# Altium footprint library User.PcbLib: 317 footprints (part 18 of 20)
Each footprint in its own frame and in the unit in brackets; x right, y up, seen from the top. Pads: shape width x height; smd on the part's side, far side on the other; paste and mask are expansions set on the pad; w line width, h text height; cw(c..) or ccw(c..) is an arc to the next point about the centre after c.
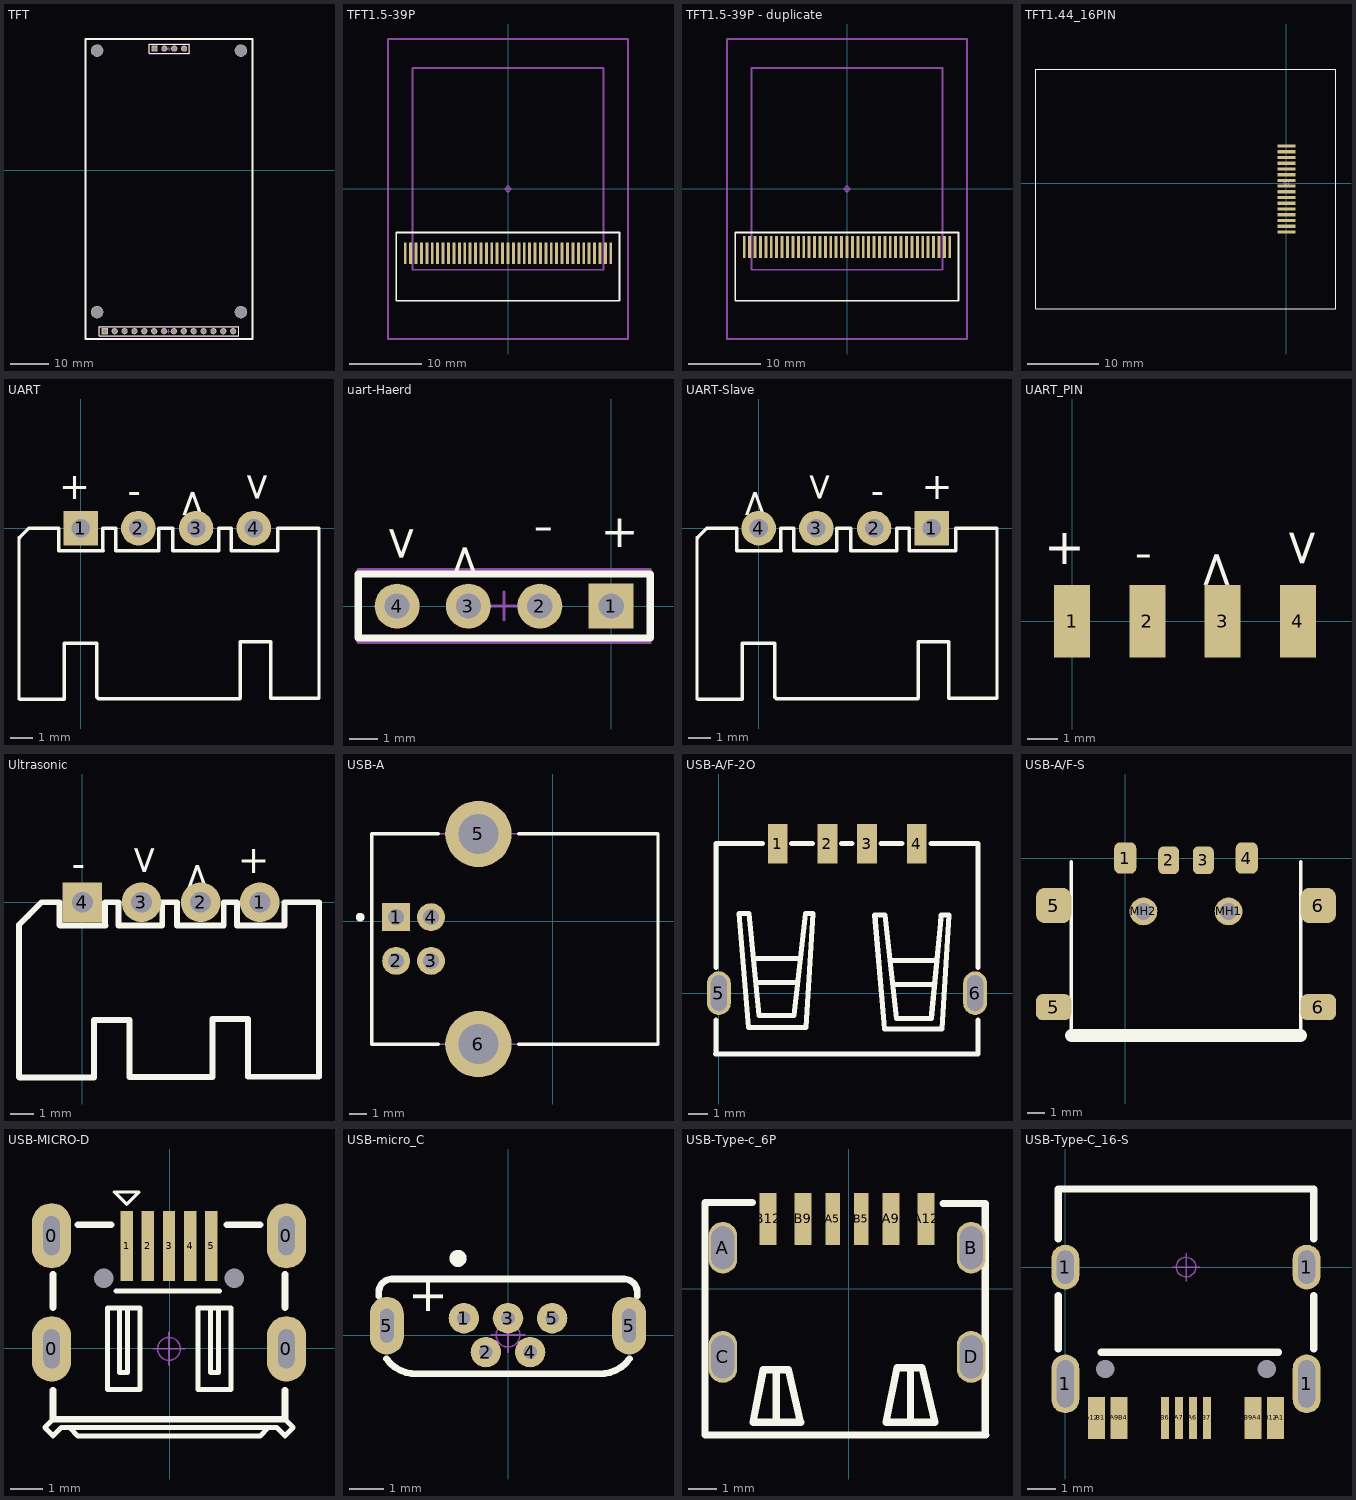
[diagram p17: the footprints below, top view; thin cyan lines are the x and y axes]

## TFT [mm] "SPI_4+14"
pads (22):
  rect 1.6x1.6 hole 1.2: 1(50.832,31.225) 5(38.045,-41.475)
  round 1.6 hole 1.2: 2(53.372,31.225) 3(55.912,31.225) 4(58.452,31.225) 6(40.585,-41.475) 7(43.125,-41.475) 8(45.665,-41.475) 9(48.205,-41.475) 10(50.745,-41.475) 11(53.285,-41.475) 12(55.825,-41.475) 13(58.365,-41.475) 14(60.905,-41.475) 15(63.445,-41.475) 16(65.985,-41.475) 17(68.525,-41.475) 18(71.065,-41.475)
  round 3.2 hole 3: ""(36.075,-36.555) ""(36.075,30.705) ""(73.045,-36.555) ""(73.045,30.705)
Top Overlay:
  lines w0.254: 36.655,-42.618 72.445,-42.618 72.445,-40.332 36.655,-40.332 36.655,-42.618 ; 49.442,30.082 59.832,30.082 59.832,32.368 49.442,32.368 49.442,30.082
  lines w0.5: 33.075,-43.475 76.045,-43.475 76.045,33.705 33.075,33.705 33.075,-43.475
Mechanical 15:
  lines w0.1: 54.055,-41.475 55.055,-41.475 ; 54.142,31.225 55.142,31.225 ; 54.555,-41.975 54.555,-40.975 ; 54.642,30.725 54.642,31.725 ; 36.655,-42.775 72.455,-42.775 72.455,-40.175 36.655,-40.175 36.655,-42.775 ; 49.442,29.925 59.842,29.925 59.842,32.525 49.442,32.525 49.442,29.925
3D body "Header-F-2.54X4.stp": height 8.6, standoff -3.1, extent 49.437,29.975 59.847,32.475
3D body "Header-F-2.54X14.stp": height 8.6, standoff -3.1, extent 36.65,-42.725 72.46,-40.225

## TFT1.5-39P [mm] "长41.6mm，宽33.4mm，厚2.7mm，脚距0.75mm"
pads (39):
  rect 0.4x3 smd: 1(-14.25,-8.89) 2(-13.5,-8.89) 3(-12.75,-8.89) 4(-12,-8.89) 5(-11.25,-8.89) 6(-10.5,-8.89) 7(-9.75,-8.89) 8(-9,-8.89) 9(-8.25,-8.89) 10(-7.5,-8.89) 11(-6.75,-8.89) 12(-6,-8.89) 13(-5.25,-8.89) 14(-4.5,-8.89) 15(-3.75,-8.89) 16(-3,-8.89) 17(-2.25,-8.89) 18(-1.5,-8.89) 19(-0.75,-8.89) 20(0,-8.89) 21(0.75,-8.89) 22(1.5,-8.89) 23(2.25,-8.89) 24(3,-8.89) 25(3.75,-8.89) 26(4.5,-8.89) 27(5.25,-8.89) 28(6,-8.89) 29(6.75,-8.89) 30(7.5,-8.89) 31(8.25,-8.89) 32(9,-8.89) 33(9.75,-8.89) 34(10.5,-8.89) 35(11.25,-8.89) 36(12,-8.89) 37(12.75,-8.89) 38(13.5,-8.89) 39(14.25,-8.89)
Top Overlay:
  lines w0.254: -15.495,-15.5 15.468,-15.5 15.468,-6.05 -15.495,-6.05 -15.495,-15.5
Mechanical 15:
  circle w0.05: c0,0 r0.35
  lines w0.05: -0.5,0 0.5,0 ; 0,-0.5 0,0.5
  lines w0.254: -16.65,-20.8 16.65,-20.8 16.65,20.8 -16.65,20.8 -16.65,-20.8 ; -13.25,-11.2 -13.25,7.7 -13.25,16.8 13.25,16.8 13.25,-11.2 -13.25,-11.2
3D body "TFT1.5-39P.STEP": height 6.65, standoff 0, extent -16.65,-20.884 16.65,20.85

## TFT1.5-39P - duplicate [mm] "长41.6mm，宽33.4mm，厚2.7mm，脚距0.75mm"
pads (39):
  rect 0.4x3 smd: 1(-14.25,-8.05) 2(-13.5,-8.05) 3(-12.75,-8.05) 4(-12,-8.05) 5(-11.25,-8.05) 6(-10.5,-8.05) 7(-9.75,-8.05) 8(-9,-8.05) 9(-8.25,-8.05) 10(-7.5,-8.05) 11(-6.75,-8.05) 12(-6,-8.05) 13(-5.25,-8.05) 14(-4.5,-8.05) 15(-3.75,-8.05) 16(-3,-8.05) 17(-2.25,-8.05) 18(-1.5,-8.05) 19(-0.75,-8.05) 20(0,-8.05) 21(0.75,-8.05) 22(1.5,-8.05) 23(2.25,-8.05) 24(3,-8.05) 25(3.75,-8.05) 26(4.5,-8.05) 27(5.25,-8.05) 28(6,-8.05) 29(6.75,-8.05) 30(7.5,-8.05) 31(8.25,-8.05) 32(9,-8.05) 33(9.75,-8.05) 34(10.5,-8.05) 35(11.25,-8.05) 36(12,-8.05) 37(12.75,-8.05) 38(13.5,-8.05) 39(14.25,-8.05)
Top Overlay:
  lines w0.254: -15.495,-15.5 -15.495,-6.05 15.468,-6.05 15.468,-15.5 -15.495,-15.5
Mechanical 15:
  circle w0.05: c0,0 r0.35
  lines w0.05: -0.5,0 0.5,0 ; 0,-0.5 0,0.5
  lines w0.254: -16.65,-20.8 -16.65,20.8 16.65,20.8 16.65,-20.8 -16.65,-20.8 ; -13.25,-11.2 13.25,-11.2 13.25,16.8 -13.25,16.8 -13.25,7.7 -13.25,-11.2
3D body "TFT1.5-39P.STEP": height 6.65, standoff 0, extent -16.65,-20.884 16.65,20.85

## TFT1.44_16PIN [mm]
pads (16):
  rect 2.5x0.45 smd: 1(0,5.2) 2(0,4.4) 3(0,3.6) 4(0,2.8) 5(0,2) 6(0,1.2) 7(0,0.4) 8(0,-0.4) 9(0,-1.2) 10(0,-2) 11(0,-2.8) 12(0,-3.6) 13(0,-4.4) 14(0,-5.2) 15(0,-6) 16(0,-6.8)
Top Overlay:
  lines w0.127: -35.015,-17.57 6.925,-17.57 6.925,15.958 -35.015,15.958 -35.015,-17.57
Mechanical 15:
  circle w0.05: c0,0 r0.35
  lines w0.05: -0.5,0 0.5,0 ; 0,-0.5 0,0.5
3D body "TFT1.44.STEP": height 2.75, standoff -0.01, extent -35.044,-17.481 6.896,15.869

## UART [mil] "-XH2.54-4PIN"
pads (4):
  rect 60x60 hole 32: 1(0,0)
  round 60 hole 32: 2(100,0) 3(200,0) 4(300,0)
Top Overlay:
  lines w6.06: 26.14,-199.13 -28.11,-199.13 -28.11,-296.38 -105.91,-296.38 -106.93,-295.35 -106.93,-16.93 -103.07,-13.07 -90,0 -38.35,0 -38.35,-38.66 -37.8,-39.21 39.21,-39.21 38.66,-38.66 38.66,0 61.18,0 61.18,-39.45 134.65,-39.45 135.2,-38.9 135.2,0 ; 28.19,-199.13 28.19,-293.31 30.24,-295.35 275.91,-295.35 276.93,-294.33 276.93,-198.11 ; 135.67,0 159.21,0 ; 159.76,-39.21 159.76,0 ; 160.55,-39.21 238.82,-39.21 239.06,-38.98 239.06,0 260.55,0 ; 261.1,0 261.1,-39.45 341.97,-39.45 ; 276.93,-197.09 329.13,-197.09 329.61,-197.56 329.61,-294.88 413.07,-294.88 413.07,0 343.54,0 ; 341.97,-38.43 341.97,0
  text "<" at 270.11,44 h80
  text "+" at 17,34.23 h80
  text "<" at 229.89,69 h80
  text "-" at 82,92.23 h80
  text "<" at 270.11,44 h80
  text "+" at 17,34.23 h80
  text "<" at 229.89,69 h80
  text "-" at 82,92.23 h80
3D body "HDR2.54xV4.STEP": height 236.11, standoff -78.63, extent -105,-300 415,10.75

## uart-Haerd [mm]
pads (4):
  rect 1.6x1.6 hole 0.9: 1(0,0)
  round 1.6 hole 0.9: 2(-2.54,0) 3(-5.08,0) 4(-7.62,0)
Top Overlay:
  lines w0.254: -9,-1.143 -9,1.143 1.39,1.143 1.39,-1.143 -9,-1.143
  text "<" at -4.309,2.261 h2.03
  text "<" at -8.367,1.549 h2.03
  text "+" at -0.367,1.695 h2.03
  text "-" at -2.779,1.71 h2.54
Mechanical 15:
  lines w0.1: -4.31,0 -3.31,0 ; -3.81,-0.5 -3.81,0.5 ; -9.01,-1.3 -9.01,1.3 1.39,1.3 1.39,-1.3 -9.01,-1.3
3D body "Header-F-2.54X4.stp": height 8.6, standoff -3.1, extent -9.015,-1.25 1.395,1.25

## UART-Slave [mil]
pads (4):
  rect 60x60 hole 32: 1(300,0)
  round 60 hole 32: 2(200,0) 3(100,0) 4(0,0)
Top Overlay:
  lines w6.06: 26.14,-199.13 -28.11,-199.13 -28.11,-296.38 -105.91,-296.38 -106.93,-295.35 -106.93,-16.93 -103.07,-13.07 -90,0 -38.35,0 -38.35,-38.66 -37.8,-39.21 39.21,-39.21 38.66,-38.66 38.66,0 61.18,0 61.18,-39.45 134.65,-39.45 135.2,-38.9 135.2,0 ; 28.19,-199.13 28.19,-293.31 30.24,-295.35 275.91,-295.35 276.93,-294.33 276.93,-198.11 ; 135.67,0 159.21,0 ; 159.76,-39.21 159.76,0 ; 160.55,-39.21 238.82,-39.21 239.06,-38.98 239.06,0 260.55,0 ; 261.1,0 261.1,-39.45 341.97,-39.45 ; 276.93,-197.09 329.13,-197.09 329.61,-197.56 329.61,-294.88 413.07,-294.88 413.07,0 343.54,0 ; 341.97,-38.43 341.97,0
  text "+" at 283,34.23 h80
  text "<" at 70.11,44 h80
  text "<" at 29.89,69 h80
  text "-" at 218,92.23 h80
3D body "HDR2.54xV4.STEP": height 236.11, standoff -78.63, extent -105,-300 415,10.75

## UART_PIN [mm]
pads (4):
  rect 1.2x2.4 smd: 1(0,0) 2(2.5,0) 3(5,0) 4(7.5,0)
Top Overlay:
  text "<" at 6.734,1.753 h2.03
  text "+" at 0.432,1.504 h2.03
  text "<" at 5.712,2.388 h2.03
  text "-" at 2.083,2.978 h2.03

## Ultrasonic [mm] "-XH2.54-4PIN"
pads (4):
  round 1.7 hole 0.9: 1(7.62,0) 2(5.08,0) 3(2.54,0)
  rect 1.7x1.7 hole 0.9: 4(0,0)
Top Overlay:
  lines w0.254: 3.434,0 3.434,-0.988 3.42,-1.002 1.554,-1.002 1.554,0 0.982,0 0.982,-0.982 0.996,-0.996 -0.96,-0.996 -0.974,-0.982 -0.974,0 -1.75,0 -2.332,-0.582 -2.716,-0.966 -2.716,-7.502 -2.69,-7.528 0.508,-7.528 0.508,-5.058 2.032,-5.058 2.032,-7.502 5.588,-7.502 5.588,-5.006 7.112,-5.006 7.112,-7.49 10.16,-7.49 10.16,0 8.726,0 ; 3.446,0 4.044,0 ; 4.058,-0.996 4.058,0 ; 4.078,-0.996 6.066,-0.996 6.072,-0.99 6.072,0 6.618,0 ; 6.632,0 6.632,-1.002 8.686,-1.002 ; 8.686,-0.976 8.686,0
  text "-" at -0.457,2.343 h2.03
  text "+" at 8.052,0.869 h2.03
  text "<" at 5.839,1.753 h2.03
  text "<" at 1.781,1.118 h2.03
3D body "XH2.54-4P_H.STEP": height 5.73, standoff -3.37, extent -2.5,-7.35 10.12,0.35

## USB-A [mm] "USB"
pads (6):
  rect 1.6x1.6 hole 0.92: 1(-8.96,0.23)
  round 1.6 hole 0.92: 2(-8.96,-2.27) 3(-6.96,-2.27) 4(-6.96,0.23)
  round 3.8 hole 2.3: 5(-4.25,5) 6(-4.25,-7.04)
Top Overlay:
  circle w0.25: c-11.02,0.23 r0.125
  lines w0.2: -6.55,-7.04 -10.37,-7.04 -10.37,5 -6.55,5 ; -1.95,-7.04 6.03,-7.04 6.03,5 -1.95,5
Mechanical 13:
  lines w0.1: -10.37,-7.04 -10.37,5 6.03,5 6.03,-7.04 -10.37,-7.04
3D body: height 11.1, standoff 0, extent -10.37,-7.04 6.03,5

## USB-A/F-2O [mm]
pads (6):
  rect 1x2 smd: 1(2.975,7.52) 2(5.474,7.52) 3(7.476,7.52) 4(9.975,7.52)
  oval 1.2x2.2 hole 0.8 slot 1.8 at 90 deg: 5(0.013,-0.002) 6(12.911,-0.002)
Top Overlay:
  lines w0.254: -0.15,-3.068 13.05,-3.068 13.05,-1.342 ; -0.14,-3.068 -0.14,-1.349 ; -0.14,1.294 -0.14,7.532 2.218,7.532 ; 1.81,1.743 4.07,1.743 ; 1.949,0.533 3.979,0.533 ; 3.681,7.532 4.717,7.532 ; 6.18,7.532 6.719,7.532 ; 8.182,7.532 9.218,7.532 ; 8.691,1.644 10.951,1.644 ; 8.831,0.434 10.861,0.434 ; 10.681,7.532 13.05,7.532 13.05,1.287 ; 1.024,4.008 1.507,-1.732 4.402,-1.732 4.758,4.008 4.377,4.008 3.787,-1.127 2.037,-1.127 1.532,4.008 1.024,4.008 ; 7.858,3.942 8.353,-1.793 11.239,-1.798 11.587,3.939 11.206,3.939 11.176,3.509 10.702,-1.269 8.953,-1.28 8.877,-0.602 8.367,3.939 7.858,3.942

## USB-A/F-S [mm]
pads (10):
  rrect50% 1.27x1.8 smd: 1(0,0) 4(7,0)
  rrect50% 1.2x1.6 smd: 2(2.5,-0.127) 3(4.5,-0.127)
  rrect50% 2.032x1.5 smd: 5(-4.125,-8.592) 6(11.125,-8.592)
  rrect50% 2.032x2.032 smd: 5(-4.125,-2.738) 6(11.125,-2.738)
  round 1.6 hole 1 unplated: MH1(5.95,-3.076) MH2(1.05,-3.076)
Top Overlay:
  lines w0.2: -3.1,-10.226 -3.1,-5.876 -3.1,-0.226 ; 10.1,-10.226 10.1,-5.876 10.1,-0.226
  lines w0.762: -3.1,-10.226 10.1,-10.226
3D body "1.stp": height 6.4, standoff -0.1, extent -5.118,-11.048 12.118,0.014

## USB-MICRO-D [mm] "USB"
pads (11):
  oval 1.2x2 hole 0.5 slot 1.2 at 90 deg: 0(-3.625,-0.025) 0(-3.625,3.445) 0(3.575,-0.025) 0(3.575,3.445)
  round 0 hole 0.6 unplated: 0(-2.025,2.145) 0(1.975,2.145)
  rect 0.381x2.15 smd: 1(-1.325,3.135) 2(-0.675,3.135) 3(-0.025,3.135) 4(0.625,3.135) 5(1.275,3.135)
Top Overlay:
  lines w0.1: -1.706,4.786 -1.325,4.405 -0.944,4.786 -1.706,4.786
  lines w0.152: -3.581,-2.184 -3.835,-2.438 -3.581,-2.692 -3.327,-2.438 -3.073,-2.438 ; -1.645,1.744 1.53,1.744 ; -1.549,1.232 -1.549,-0.753 -1.346,-0.753 -1.295,-0.753 -1.295,1.232 ; 1.245,1.232 1.245,-0.753 1.499,-0.753 1.499,1.232 ; 3.531,-2.184 3.785,-2.438 3.531,-2.692 3.277,-2.438 3.023,-2.438 ; -3.073,-2.438 3.023,-2.438 ; -3.073,-2.438 -2.819,-2.699 2.769,-2.699 3.023,-2.438 ; -1.91,-1.268 -1.91,1.232 -0.91,1.232 -0.91,-1.268 -1.91,-1.268 ; 0.871,-1.268 1.871,-1.268 1.871,1.232 0.871,1.232 0.871,-1.268
  lines w0.203: -3.581,-1.295 -3.581,-2.184 3.531,-2.184 3.531,-1.295 ; -3.581,1.245 -3.581,2.261 ; -2.819,3.785 -1.803,3.785 ; 1.753,3.785 2.769,3.785 ; 3.531,1.245 3.531,2.261
Mechanical 15:
  circle w0.05: c-0.025,-0.025 r0.35
  lines w0.05: -0.525,-0.025 0.475,-0.025 ; -0.025,-0.525 -0.025,0.475
3D body "USB micro_D.STEP": height 2.79, standoff -0.95, extent -4.011,-2.775 3.96,3.925

## USB-micro_C [mm] "USB"
pads (7):
  round 0.9 hole 0.4: 1(-1.3,0.5) 2(-0.65,-0.5) 3(0,0.5) 4(0.65,-0.5) 5(1.3,0.5)
  oval 1x1.7 hole 0.4 slot 1 at 90 deg: 5(-3.575,0.28) 5(3.575,0.28)
Top Overlay:
  circle w0.254: c-1.473,2.261 r0.127
  lines w0.2: -3.81,1.143 -3.81,1.27 cw(c-3.429,1.27) -3.429,1.651 -3.175,1.651 -2.794,1.651 2.794,1.651 3.175,1.651 3.429,1.651 cw(c3.429,1.27) 3.81,1.27 3.81,1.143 ; -3.587,-0.697 ccw(c-2.718,-0.076) -2.667,-1.143 ; -2.629,-1.143 -2.413,-1.143 2.413,-1.143 2.667,-1.143 ccw(c2.718,-0.076) 3.587,-0.697
  text "+" at -1.905,0.559 h1.02
Mechanical 15:
  circle w0.05: c0,0 r0.35
  lines w0.05: -0.5,0 0.5,0 ; 0,-0.5 0,0.5
3D body "USB micro_C.STEP": height 5.65, standoff -1.55, extent -4.001,-1.207 4.001,1.767

## USB-Type-c_6P [mm]
pads (10):
  oval 1x1.8 hole 0.8 slot 1.5 at 90 deg: A(-4.38,1.43) B(4.256,1.43) C(-4.38,-2.37) D(4.256,-2.37)
  rect 0.5x1.8 smd: A5(-0.56,2.43) B5(0.44,2.43)
  rect 0.6x1.8 smd: A9(1.47,2.43) A12(2.69,2.43) B9(-1.59,2.43) B12(-2.81,2.43)
Top Overlay:
  lines w0.254: -5,-5.082 -5,3 -3.349,3 ; -4.99,-5.082 4.76,-5.082 ; -2.525,-4.618 -2.525,-2.918 ; 2.15,-4.643 2.15,-2.743 ; 3.277,2.97 4.7,2.97 ; 4.75,-5.082 4.75,2.97 ; -3.335,-4.643 -1.673,-4.643 -2.1,-2.819 -2.975,-2.819 -3.335,-4.643 ; 1.3,-4.643 1.675,-2.743 2.55,-2.743 2.995,-4.643 1.3,-4.643
3D body "USB Type-C_B.STEP": height 3.22, standoff -0.94, extent -4.53,-4.97 4.41,1.83

## USB-Type-C_16-S [mm]
pads (18):
  round 0 hole 0.65: 0(1.43,-3.65) 0(7.21,-3.65)
  oval 1x2.1 hole 0.6 slot 1.7 at 90 deg: 1(0,-4.18) 1(8.64,-4.18)
  oval 1x1.6 hole 0.6 slot 1.2 at 90 deg: 1(0,0) 1(8.64,0)
  rect 0.3x1.5 smd: A1(7.67,-5.4) A4(6.87,-5.4) A6(4.57,-5.4) A7(4.07,-5.4) A9(1.77,-5.4) A12(0.97,-5.4) B1(1.27,-5.4) B4(2.07,-5.4) B6(3.57,-5.4) B7(5.07,-5.4) B9(6.57,-5.4) B12(7.37,-5.4)
Top Overlay:
  lines w0.254: -0.252,-2.921 -0.252,-1.016 ; -0.252,1.016 -0.252,2.794 8.892,2.794 8.892,1.016 ; 1.272,-3.048 7.622,-3.048 ; 8.892,-2.921 8.892,-1.016
Mechanical 15:
  circle w0.05: c4.32,0 r0.35
  lines w0.05: 3.82,0 4.82,0 ; 4.32,-0.5 4.32,0.5
3D body "USB Type-C_A.STEP": height 3.25, standoff -0.85, extent -0.15,-5.3 8.79,2.6